# Altium footprint library through.PcbLib: 15 footprints
Each footprint in its own frame and in the unit in brackets; x right, y up, seen from the top. Pads: shape width x height; smd on the part's side, far side on the other; paste and mask are expansions set on the pad; w line width, h text height; cw(c..) or ccw(c..) is an arc to the next point about the centre after c.
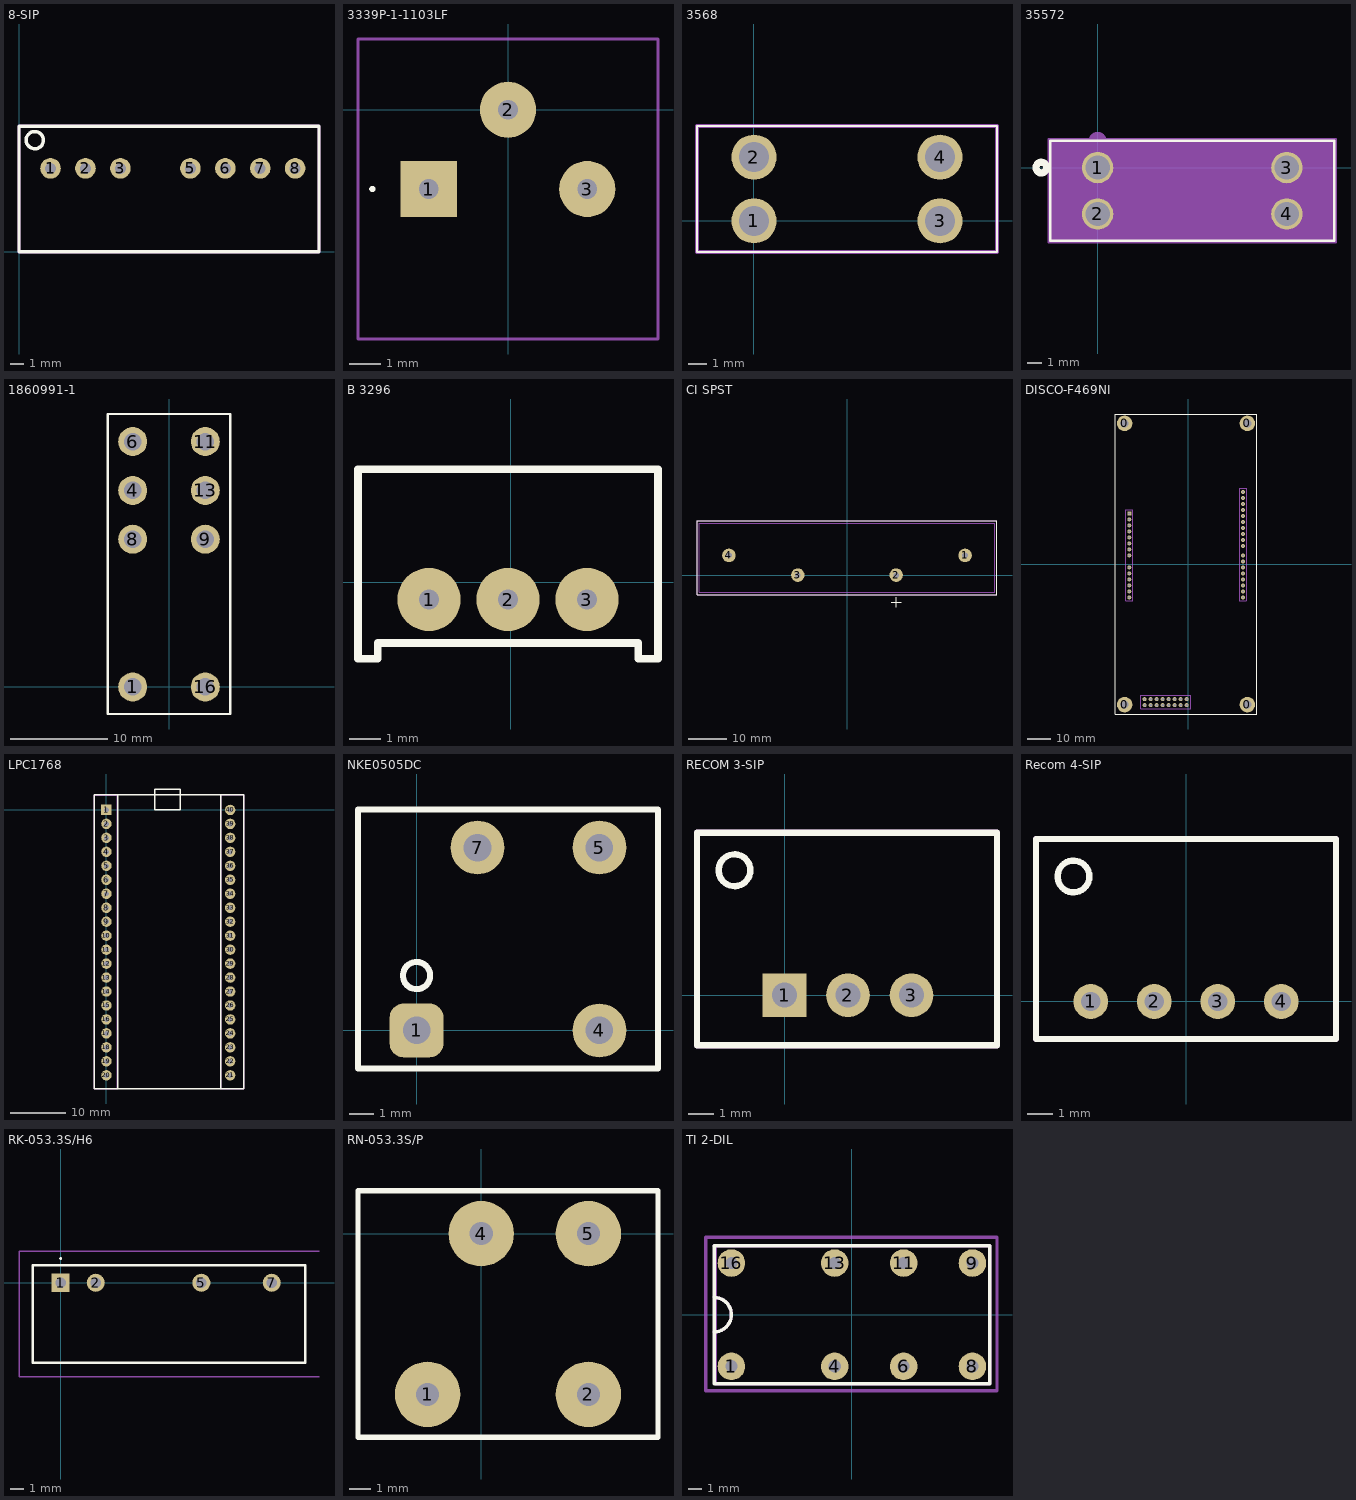
[diagram p0: the footprints below, top view; thin cyan lines are the x and y axes]

## 8-SIP [mm]
pads (7):
  round 1.5 hole 0.8: 1(2.29,6.05) 2(4.83,6.05) 3(7.37,6.05) 5(12.45,6.05) 6(14.99,6.05) 7(17.53,6.05) 8(20.07,6.05)
Top Overlay:
  circle w0.254: c1.15,8.1 r0.626
  lines w0.254: 0,0 0,9.1 21.8,9.1 21.8,0 0,0
Mechanical 15:
  lines w0.254: 0,0 0,9.1 21.8,9.1 21.8,0 0,0
3D body "tmr3wi.stp": height 11.2, standoff -4.1, extent 0,0 21.798,9.098

## 3339P-1-1103LF [mm]
pads (3):
  rect 1.8x1.8 hole 0.63: 1(-2.54,-2.54)
  round 1.8 hole 0.63: 2(0,0) 3(2.54,-2.54)
Top Overlay:
  lines w0.1: -4.4,-2.54 ccw(c-4.35,-2.54) -4.3,-2.54 ccw(c-4.35,-2.54) -4.4,-2.54
Mechanical 15:
  lines w0.1: -4.81,-7.35 4.81,-7.35 4.81,2.27 -4.81,2.27 -4.81,-7.35
3D body "3339P-1-103LF.stp": height 6.7, standoff -5, extent -3.81,-6.35 3.81,1.27

## 3568 [mm]
pads (4):
  round 2.4 hole 1.6: 1(0,0) 2(0,3.4) 3(9.92,0) 4(9.92,3.4)
Top Overlay:
  lines w0.1: -3.04,-1.665 12.96,-1.665 12.96,5.065 -3.04,5.065 -3.04,-1.665
Mechanical 15:
  lines w0.2: -3.04,-1.665 12.96,-1.665 12.96,5.065 -3.04,5.065 -3.04,-1.665
3D body "3568.stp": height 1.97, standoff -8.19, extent -2.92,-1.587 13.08,5.143

## 35572 [mil]
pads (4):
  round 88 / inner round 60 / far side round 88 hole 68 paste-99999 mask+0: 1(0,0) 2(0,-130) 3(530,0) 4(530,-130)
Top Overlay:
  circle w20: c-157.5,0 r15
  lines w6: -132.5,-205 -132.5,75 662.5,75 662.5,-205 -132.5,-205
Bottom Overlay:
  circle w20: c-157.5,0 r15
Mechanical 13:
  circle w20: c0,75 r15
  lines w1: -127.5,-200 -127.5,70 657.5,70 657.5,-200 -127.5,-200
Mechanical 15:
  region: 667.5,80 -137.5,80 -137.5,-210 667.5,-210
  lines w6: -137.5,-210 667.5,-210 667.5,80 -137.5,80 -137.5,-210

## 1860991-1 [mm] "Relay Socket 5A"
pads (8):
  round 3 / inner round 3 / far side round 3.8 hole 1.8: 1(-3.75,0) 4(-3.75,20.3) 6(-3.75,25.34) 8(-3.75,15.26) 9(3.75,15.26) 11(3.75,25.34) 13(3.75,20.3) 16(3.75,0)
Top Overlay:
  lines w0.254: -6.35,-2.794 6.35,-2.794 6.35,28.194 -6.35,28.194 -6.35,-2.794
3D body "c-1860991-1-c-3d.stp": height 8.9, standoff -4.75, extent -6.325,-2.775 6.325,28.175

## B 3296 [mil]
pads (3):
  round 80 hole 25.2: 1(-103.39,-22) 2(-3.39,-22) 3(96.61,-22)
Top Overlay:
  lines w10: -193.39,-97 -193.39,143 186.61,143 186.61,-97 161.61,-97 161.61,-77 -168.39,-77 -168.39,-97 -193.39,-97
3D body "User Library-3299W-1-103RLF.STEP": height 455, standoff -245, extent -190.89,-97 184.11,143

## CI SPST [mm]
pads (4):
  round 3.5 hole 1.45: 1(30.48,5.08) 2(12.7,0) 3(-12.7,0) 4(-30.48,5.08)
Top Overlay:
  lines w0.254: 11.43,-6.985 12.065,-6.985 13.97,-6.985 ; 12.7,-8.255 12.7,-5.715 ; -38.735,-5.08 38.735,-5.08 38.735,13.97 -38.735,13.97 -38.735,-5.08
Mechanical 13:
  lines w0.254: -38.1,-4.445 38.1,-4.445 38.1,13.335 -38.1,13.335 -38.1,-4.445
Mechanical 15:
  lines w0.254: -38.735,-5.08 38.735,-5.08 38.735,13.97 -38.735,13.97 -38.735,-5.08
3D body: height 20.57, standoff 0, extent -38.1,-4.445 38.1,13.335

## DISCO-F469NI [mm]
pads (52):
  round 6.6 hole 3.3: 0(-27,-59.5) 0(-27,59.5) 0(25,-59.5) 0(25,59.5)
  rect 1.7x1.7 hole 0.95: 1(-25,21.391)
  round 1.7 hole 0.95: 2(-25,18.851) 3(-25,16.311) 4(-25,13.771) 5(-25,11.231) 6(-25,8.691) 7(-25,6.151) 8(-25,3.611) 9(-25,-1.469) 10(-25,-4.009) 11(-25,-6.549) 12(-25,-9.089) 13(-25,-11.629) 14(-25,-14.169) 15(23.103,30.499) 16(23.103,27.959) 17(23.103,25.419) 18(23.103,22.879) 19(23.103,20.339) 20(23.103,17.799) 21(23.103,15.259) 22(23.103,12.719) 23(23.103,10.179) 24(23.103,7.639) 25(23.103,3.611) 26(23.103,1.071) 27(23.103,-1.469) 28(23.103,-4.009) 29(23.103,-6.549) 30(23.103,-9.089) 31(23.103,-11.629) 32(23.103,-14.169) 33(-0.727,-57.213) 34(-3.267,-57.213) 35(-5.807,-57.213) 36(-8.347,-57.213) 37(-10.887,-57.213) 38(-13.427,-57.213) 39(-15.967,-57.213) 40(-18.558,-57.213) 41(-18.507,-59.753) 42(-15.967,-59.753) 43(-13.427,-59.753) 44(-10.887,-59.753) 45(-8.347,-59.753) 46(-5.807,-59.753) 47(-3.267,-59.753) 48(-0.727,-59.753)
Top Overlay:
  lines w0.254: -31,-63.5 29,-63.5 29,63.5 -31,63.5 -31,-63.5
Mechanical 13:
  lines w0.254: -26.5,-15.609 -26.5,22.891 -23.5,22.891 -23.5,-15.609 -26.5,-15.609 ; -20.25,-61.359 -20.25,-55.609 1,-55.609 1,-61.359 -20.25,-61.359 ; 21.6,-15.609 21.6,31.991 24.6,31.991 24.6,-15.609 21.6,-15.609
3D body "F469IDISCOVERY.STEP": height -0.86, standoff -16.86, extent -31.096,-64.691 29.951,63.885

## LPC1768 [mm]
pads (40):
  rect 1.9x1.9 hole 0.889: 1(0,0)
  round 1.9 hole 0.889: 2(0,-2.54) 3(0,-5.08) 4(0,-7.62) 5(0,-10.16) 6(0,-12.7) 7(0,-15.24) 8(0,-17.78) 9(0,-20.32) 10(0,-22.86) 11(0,-25.4) 12(0,-27.94) 13(0,-30.48) 14(0,-33.02) 15(0,-35.56) 16(0,-38.1) 17(0,-40.64) 18(0,-43.18) 19(0,-45.72) 20(0,-48.26) 21(22.5,-48.26) 22(22.5,-45.72) 23(22.5,-43.18) 24(22.5,-40.64) 25(22.5,-38.1) 26(22.5,-35.56) 27(22.5,-33.02) 28(22.5,-30.48) 29(22.5,-27.94) 30(22.5,-25.4) 31(22.5,-22.86) 32(22.5,-20.32) 33(22.5,-17.78) 34(22.5,-15.24) 35(22.5,-12.7) 36(22.5,-10.16) 37(22.5,-7.62) 38(22.5,-5.08) 39(22.5,-2.54) 40(22.5,0)
Top Overlay:
  lines w0.254: 2.032,-50.75 2.032,2.667 ; 20.75,-50.75 20.75,2.75 ; -2.25,-50.75 25,-50.75 25,2.794 -2.25,2.794 -2.25,-50.75 ; 8.763,0 8.763,1.143 8.763,3.81 13.462,3.81 13.462,0 8.763,0
Mechanical 13:
  lines w0.254: -2.25,-50.75 -2.25,2.7 2,2.7 2,-50.75 -1.9,-50.75 -2.25,-50.75 ; 20.75,-50.7 20.75,2.8 25,2.8 25,-50.7 20.75,-50.7
3D body: height 8, standoff 0, extent 20.75,-50.673 25,2.794
3D body: height 8, standoff 0, extent -2.25,-50.75 2,2.75
3D body "MBED.STEP": height 16.84, standoff 5.2, extent -1.75,-50.5 24.25,5.283

## NKE0505DC [mm] "DC DC CONVERTER 5V 1W"
pads (4):
  rrect50% 2.24x2.24 hole 1.15: 1(0,0)
  round 2.24 hole 1.15: 4(7.62,0) 5(7.62,7.62) 7(2.54,7.62)
Top Overlay:
  circle w0.254: c0,2.286 r0.568
  lines w0.254: -2.44,-1.59 -2.44,9.21 10.06,9.21 10.06,-1.59 -2.44,-1.59
3D body "mps_dcdc_nke_dc_a.step": height 5.42, standoff -4.1, extent -1.94,-1.11 9.56,8.71

## RECOM 3-SIP [mm] "12 to 42 Vdc In, 9 Vdc Out"
height 8.5
pads (3):
  rect 1.75x1.75 hole 1: 1(0,0)
  round 1.75 hole 1: 2(2.54,0) 3(5.08,0)
Top Overlay:
  circle w0.254: c-2,5 r0.635
  lines w0.254: -3.5,-2 -3.5,6.5 8.5,6.5 8.5,-2 -3.5,-2
Mechanical 13:
  lines w0.254: -3.5,-2 8.5,-2 8.5,6.5 -3.5,6.5 -3.5,-2
Mechanical 15:
  lines w0.254: -3.5,-2 8.5,-2 8.5,6.5 -3.5,6.5 -3.5,-2
3D body "rb78c.STEP": height 11.41, standoff -3.1, extent -3.262,-2.022 8.338,6.478

## Recom 4-SIP [mil]
pads (4):
  round 55 hole 30: 1(-150,0) 2(-50,0) 3(50,0) 4(150,0)
Top Overlay:
  circle w10: c-177.17,196.85 r25
  lines w10: -236.22,-59.06 -236.22,255.91 236.22,255.91 236.22,-59.06 -236.22,-59.06
Mechanical 13:
  lines w10: -236.22,-59.06 -236.22,255.91 236.22,255.91 236.22,-59.06 -236.22,-59.06
Mechanical 15:
  lines w10: -236.22,-59.06 -236.22,255.91 236.22,255.91 236.22,-59.06 -236.22,-59.06
3D body "ridc-dc.STEP": height 122.05, standoff -441.34, extent -225.43,-50.57 227.32,248.64

## RK-053.3S/H6 [mm]
pads (4):
  rect 1.303x1.303 hole 0.76: 1(0,0)
  round 1.303 hole 0.76: 2(2.54,0) 5(10.16,0) 7(15.24,0)
Top Overlay:
  lines w0.1: 0,1.7 ccw(c0,1.75) 0,1.8 ccw(c0,1.75) 0,1.7
  lines w0.2: -2,-5.78 -2,1.27 17.65,1.27 17.65,-5.78 -2,-5.78
Mechanical 13:
  lines w0.1: -2,-5.78 17.65,-5.78 17.65,1.27 -2,1.27 -2,-5.78
Mechanical 15:
  lines w0.1: 18.65,-6.78 -3,-6.78 -3,2.27 18.65,2.27
3D body "RK-053.3S_H6.stp": height 10.2, standoff -4.1, extent -1.995,-5.785 17.655,1.265

## RN-053.3S/P [mm]
pads (4):
  round 3.1 hole 1.1: 1(-2.54,-7.62) 2(5.08,-7.62) 4(0,0) 5(5.08,0)
Top Overlay:
  lines w0.254: -5.842,-9.652 8.382,-9.652 8.382,2.032 -5.842,2.032 -5.842,-9.652
3D body "RN-053.3S_P.stp": height 7.62, standoff -3.25, extent -5.03,-8.86 7.57,1.24

## TI 2-DIL [mil]
pads (8):
  round 80 hole 35.43: 1(-350,-150) 4(-50,-150) 6(150,-150) 8(350,-150) 9(350,150) 11(150,150) 13(-50,150) 16(-350,150)
Top Overlay:
  lines w10: -400,-50 ccw(c-400,0) -400,50 ; -400,-200 400,-200 400,200 -400,200 -400,-200
Mechanical 13:
  lines w10: -400,-50 ccw(c-400,0) -400,50 ; -400,200 400,200 400,-200 -395.28,-200 -397.64,-197.64 -397.64,196.85
Mechanical 15:
  lines w10: -425.2,-220.47 421.26,-220.47 421.26,224.41 -425.2,224.41 -425.2,-220.47
3D body "TI 2-DIL.stp": height 450, standoff -109.06, extent -397.64,-196.85 397.64,196.85